# Altium footprint library 零散封装库.PcbLib: 8 footprints
Each footprint in its own frame and in the unit in brackets; x right, y up, seen from the top. Pads: shape width x height; smd on the part's side, far side on the other; paste and mask are expansions set on the pad; w line width, h text height; cw(c..) or ccw(c..) is an arc to the next point about the centre after c.
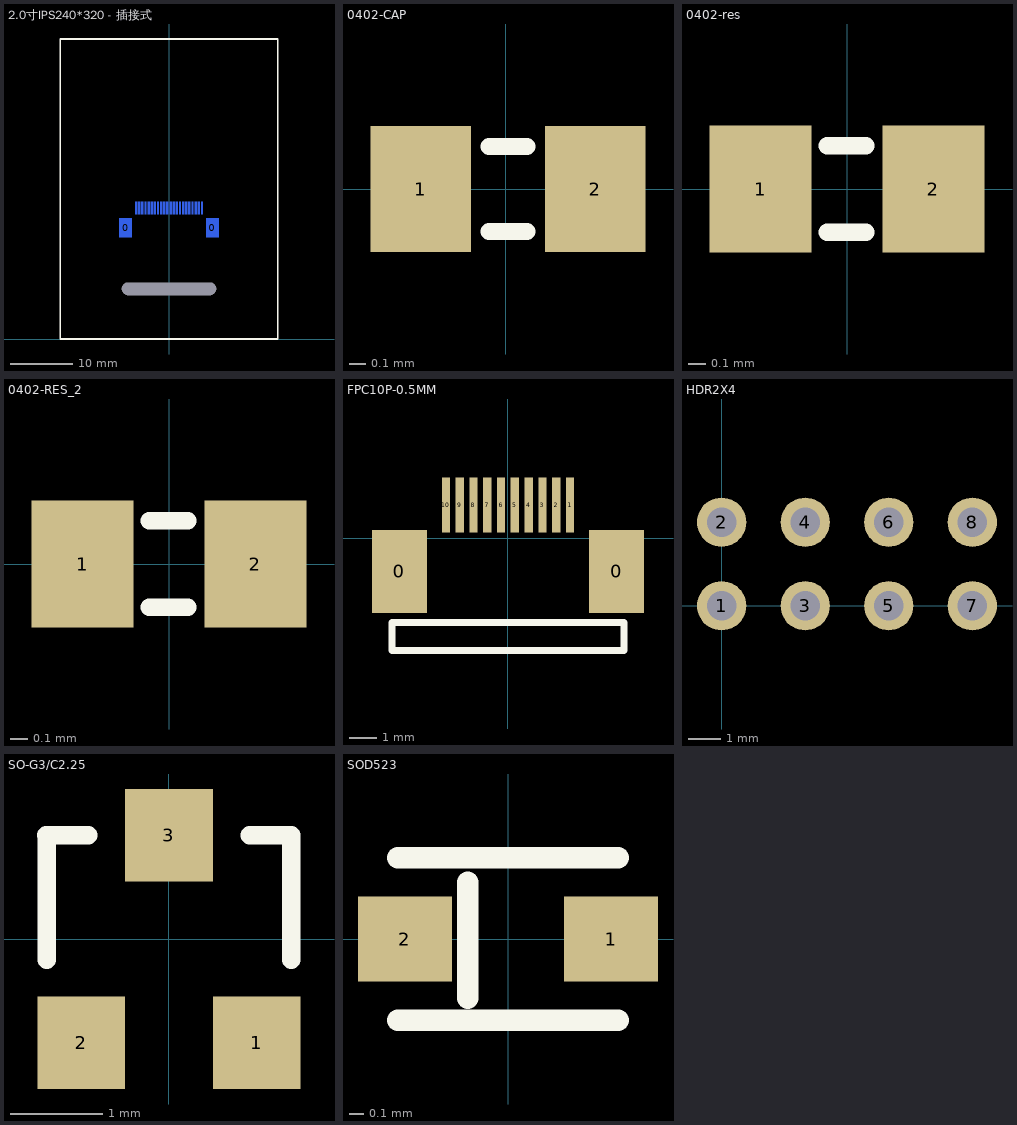
[diagram p0: the footprints below, top view; thin cyan lines are the x and y axes]

## 2.0寸IPS240*320 - 插接式 [mm]
pads (25):
  rect 2x3 smd far side: 0(-6.9,17.7) 0(6.9,17.7)
  round 0 hole 2 slot 15 at 0 deg: 0(0,8)
  rect 0.3x2 smd far side: 1(-5.248,20.848) 2(-4.75,20.85) 3(-4.25,20.85) 4(-3.75,20.85) 5(-3.25,20.85) 6(-2.75,20.85) 7(-2.25,20.85) 8(-1.75,20.85) 9(-1.25,20.85) 10(-0.75,20.85) 11(-0.25,20.85) 12(0.25,20.85) 13(0.75,20.85) 14(1.25,20.85) 15(1.75,20.85) 16(2.25,20.85) 17(2.75,20.85) 18(3.25,20.85) 19(3.75,20.85) 20(4.25,20.85) 21(4.75,20.85) 22(5.25,20.85)
Top Overlay:
  lines w0.254: -17.3,0 -17.3,47.8 17.3,47.8 17.3,0 -17.3,0
Bottom Overlay:
  lines w0.254: -7.3,15.041 -7.3,15.834 7.3,15.834 7.3,15.041 -7.3,15.041
  text "22P上接" at 3.646,12.758 h2.6

## 0402-CAP [mm] "Chip Capacitor, 2-Leads, Body 1.00x0.50mm, IPC Medium Density"
height 0.5
pads (2):
  rect 0.6x0.75 smd: 1(-0.508,0) 2(0.533,0)
Top Overlay:
  lines w0.102: -0.102,-0.254 0.127,-0.254 ; -0.102,0.254 0.127,0.254
3D body "CAPCP1005X05N.step": height 0.5, standoff 0, extent -0.525,-0.275 0.525,0.275

## 0402-res [mm] "Chip Resistor, 2-Leads, Body 1.00x0.50mm, IPC Medium Density"
height 0.5
pads (2):
  rect 0.6x0.75 smd: 1(-0.508,0) 2(0.508,0)
Top Overlay:
  lines w0.102: -0.117,-0.254 0.112,-0.254 ; -0.117,0.254 0.112,0.254
3D body "RESC1005X05N.step": height 0.5, standoff 0, extent -0.527,-0.275 0.523,0.275

## 0402-RES_2 [mm]
pads (2):
  rect 0.6x0.75 smd: 1(-0.508,0) 2(0.508,0)
Top Overlay:
  lines w0.102: -0.117,-0.254 0.112,-0.254 ; -0.117,0.254 0.112,0.254
3D body "RESC1005X05N.step": height 0.5, standoff 0, extent -0.527,-0.275 0.523,0.275

## FPC10P-0.5MM [mm]
pads (12):
  rect 2x3 smd: 0(-3.936,-1.202) 0(3.936,-1.202)
  rect 0.3x2 smd: 1(2.25,1.202) 2(1.75,1.202) 3(1.25,1.202) 4(0.75,1.202) 5(0.25,1.202) 6(-0.25,1.202) 7(-0.75,1.202) 8(-1.25,1.202) 9(-1.75,1.202) 10(-2.25,1.202)
Top Overlay:
  lines w0.254: -4.201,-4.065 4.199,-4.065 4.199,-3.049 -4.201,-3.049 -4.201,-4.065
3D body "FPC-10P0.5mm.stp": height 2, standoff 0, extent -4.499,-4.106 4.499,1.901

## HDR2X4 [mm] "Connector; Header; 4x2 Position"
pads (8):
  round 1.5 hole 0.9: 1(0,0) 2(0,2.54) 3(2.54,0) 4(2.54,2.54) 5(5.08,0) 6(5.08,2.54) 7(7.62,0) 8(7.62,2.54)

## SO-G3/C2.25 [mm] "SOT-23; 3 Leads; Body 3.0 x 2.5 mm, inc. leads (LxW max)"
height 1.2
pads (3):
  rect 0.95x1 smd: 1(0.95,-1.125) 2(-0.95,-1.125) 3(0,1.125)
Top Overlay:
  lines w0.2: -1.328,1.125 -0.875,1.125 ; -1.325,-0.225 -1.325,1.125 ; 0.875,1.125 1.325,1.125 1.325,-0.225
3D body "SOT-23.STEP": height 1.11, standoff 0.01, extent -1.502,-1.26 1.498,1.24

## SOD523 [mil]
pads (2):
  rect 26x23.62 smd paste+0 mask+0: 1(28.5,0) 2(-28.5,0)
Top Overlay:
  lines w6: -30.5,-22.5 30.5,-22.5 ; -30.5,22.5 30.5,22.5 ; -11.11,-16.31 -11.11,15.69
3D body "ZDO_SOD-523_STM.step": height 28.27, standoff 0, extent -33.51,-17.46 33.5,17.5